# Altium footprint library PCBKU.PcbLib: 192 footprints (part 7 of 12)
Each footprint in its own frame and in the unit in brackets; x right, y up, seen from the top. Pads: shape width x height; smd on the part's side, far side on the other; paste and mask are expansions set on the pad; w line width, h text height; cw(c..) or ccw(c..) is an arc to the next point about the centre after c.
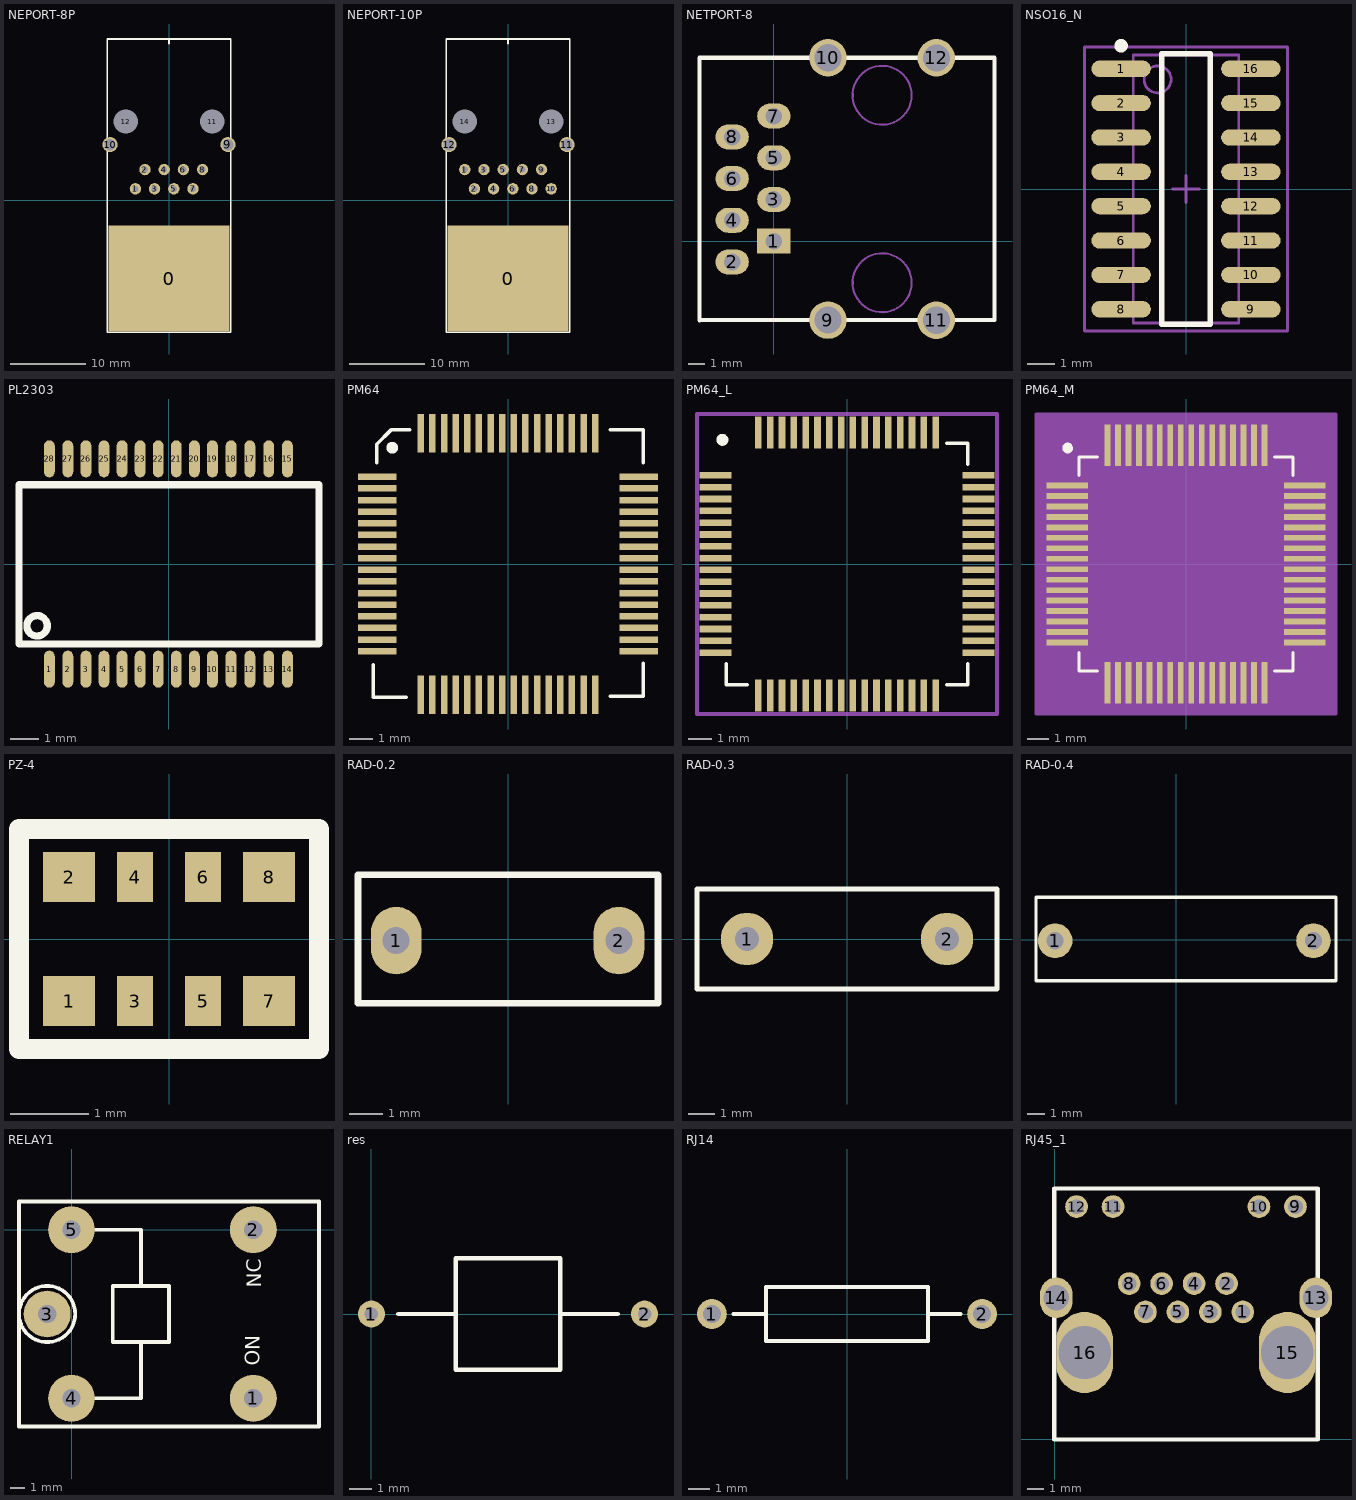
[diagram p6: the footprints below, top view; thin cyan lines are the x and y axes]

## NEPORT-8P [mm]
pads (13):
  rect 16x14 smd: 0(0.025,-10.378)
  round 1.5 hole 0.8: 1(-4.445,1.488) 2(-3.175,4.028) 3(-1.905,1.488) 4(-0.635,4.028) 5(0.635,1.488) 6(1.905,4.028) 7(3.175,1.488) 8(4.445,4.028)
  round 2 hole 1.5: 9(7.795,7.327) 10(-7.795,7.327)
  round 1.524 hole 3.2: 11(5.715,10.378) 12(-5.715,10.378)
Top Overlay:
  lines w0.203: -8.15,-17.503 8.15,-17.503 8.15,21.297 -8.15,21.297 -8.15,-17.503
  lines w0.254: 0,20.697 0,21.297

## NEPORT-10P [mm]
pads (15):
  rect 16x14 smd: 0(0.025,-10.378)
  round 1.5 hole 0.8: 1(-5.715,4.028) 2(-4.445,1.488) 3(-3.175,4.028) 4(-1.905,1.488) 5(-0.635,4.028) 6(0.635,1.488) 7(1.905,4.028) 8(3.175,1.488) 9(4.445,4.028) 10(5.715,1.488)
  round 2 hole 1.5: 11(7.795,7.327) 12(-7.795,7.327)
  round 1.524 hole 3.2: 13(5.715,10.378) 14(-5.715,10.378)
Top Overlay:
  lines w0.203: 0,20.697 0,21.297 ; -8.15,-17.503 -8.15,21.297 8.15,21.297 8.15,-17.503 -8.15,-17.503

## NETPORT-8 [mil]
height 30
pads (12):
  rect 80x60 hole 40: 1(0,0)
  oval 80x60 hole 40: 2(-100,-50) 3(0,100) 4(-100,50) 5(0,200) 6(-100,150) 7(0,300) 8(-100,250)
  round 90 hole 65: 9(129.92,-189.76) 10(129.92,440.16) 11(390,-190) 12(390,440)
Top Overlay:
  lines w10: -178.74,-190 -178.5,-189.76 ; -178.74,440 -178.58,440.16 ; 530,440 529.84,440.16 129.92,440.16 -178.58,440.16 ; 530,440.16 530,-189.76 129.92,-189.76 -178.5,-189.76 ; -178.58,440.16 -178.58,-189.69 -178.5,-189.76
Mechanical 1:
  circle w5: c260,-100 r70.8
  circle w5: c260,350 r70.8

## NSO16_N [mm] "SOIC, 16-Leads, Body 9.9x3.9mm, Pitch 1.27mm, IPC Medium Density"
height 1.75
pads (16):
  oval 2.2x0.6 smd: 1(-2.4,4.445) 2(-2.4,3.175) 3(-2.4,1.905) 4(-2.4,0.635) 5(-2.4,-0.635) 6(-2.4,-1.905) 7(-2.4,-3.175) 8(-2.4,-4.445) 9(2.4,-4.445) 10(2.4,-3.175) 11(2.4,-1.905) 12(2.4,-0.635) 13(2.4,0.635) 14(2.4,1.905) 15(2.4,3.175) 16(2.4,4.445)
Top Overlay:
  circle w0.25: c-2.4,5.295 r0.125
  lines w0.2: -0.9,-5 -0.9,5 0.9,5 0.9,-5 -0.9,-5
Mechanical 13:
  circle w0.1: c-1.05,4.05 r0.5
  lines w0.1: -1.95,-4.95 -1.95,4.95 1.95,4.95 1.95,-4.95 -1.95,-4.95
Mechanical 15:
  lines w0.1: -0.5,0 0.5,0 ; 0,-0.5 0,0.5 ; -3.75,-5.25 -3.75,5.25 3.75,5.25 3.75,-5.25 -3.75,-5.25
3D body: height 1.75, standoff 0, extent -1.95,-4.95 1.95,4.95

## PL2303 [mm]
pads (28):
  oval 0.38x1.3 smd: 1(-4.196,-3.696) 2(-3.546,-3.696) 3(-2.911,-3.696) 4(-2.276,-3.696) 5(-1.641,-3.696) 6(-1.006,-3.696) 7(-0.371,-3.696) 8(0.264,-3.696) 9(0.899,-3.696) 10(1.534,-3.696) 11(2.189,-3.696) 12(2.85,-3.696) 13(3.51,-3.696) 14(4.171,-3.696) 15(4.171,3.696) 16(3.51,3.696) 17(2.85,3.696) 18(2.189,3.696) 19(1.534,3.696) 20(0.899,3.696) 21(0.264,3.696) 22(-0.371,3.696) 23(-1.006,3.696) 24(-1.641,3.696) 25(-2.276,3.696) 26(-2.911,3.696) 27(-3.546,3.696) 28(-4.196,3.696)
Top Overlay:
  circle w0.254: c-4.628,-2.172 r0.359
  lines w0.254: -5.263,2.781 5.237,2.781 ; -5.263,2.793 -5.263,-2.807 5.237,-2.807 ; 5.278,-2.807 5.278,2.793
3D body: height 1.9, standoff 0, extent -5.125,-3.912 5.075,3.888

## PM64 [mil]
pads (64):
  rect 65.5x11 smd: 1(-221.25,147.64) 2(-221.25,127.95) 3(-221.25,108.27) 4(-221.25,88.58) 5(-221.25,68.9) 6(-221.25,49.21) 7(-221.25,29.53) 8(-221.25,9.84) 9(-221.25,-9.84) 10(-221.25,-29.53) 11(-221.25,-49.21) 12(-221.25,-68.9) 13(-221.25,-88.58) 14(-221.25,-108.27) 15(-221.25,-127.95) 16(-221.25,-147.64) 33(221.25,-147.64) 34(221.25,-127.95) 35(221.25,-108.27) 36(221.25,-88.58) 37(221.25,-68.9) 38(221.25,-49.21) 39(221.25,-29.53) 40(221.25,-9.84) 41(221.25,9.84) 42(221.25,29.53) 43(221.25,49.21) 44(221.25,68.9) 45(221.25,88.58) 46(221.25,108.27) 47(221.25,127.95) 48(221.25,147.64)
  rect 11x65.5 smd: 17(-147.64,-221.25) 18(-127.95,-221.25) 19(-108.27,-221.25) 20(-88.58,-221.25) 21(-68.9,-221.25) 22(-49.21,-221.25) 23(-29.53,-221.25) 24(-9.84,-221.25) 25(9.84,-221.25) 26(29.53,-221.25) 27(49.21,-221.25) 28(68.9,-221.25) 29(88.58,-221.25) 30(108.27,-221.25) 31(127.95,-221.25) 32(147.64,-221.25) 49(147.64,221.25) 50(127.95,221.25) 51(108.27,221.25) 52(88.58,221.25) 53(68.9,221.25) 54(49.21,221.25) 55(29.53,221.25) 56(9.84,221.25) 57(-9.84,221.25) 58(-29.53,221.25) 59(-49.21,221.25) 60(-68.9,221.25) 61(-88.58,221.25) 62(-108.27,221.25) 63(-127.95,221.25) 64(-147.64,221.25)
Top Overlay:
  lines w6: -228,-170.24 -228,-226 -172.24,-226 ; -222,171.24 -222,203 -198,227 -166.24,227 ; 173.24,-224 229,-224 229,-168.24 ; 173.24,227 229,227 229,171.24
  lines w10: -193.09,201.07 ccw(c-196,197) -191.4,198.97
3D body: height 63.1, standoff 0, extent -241,-240 239,240

## PM64_L [mil]
pads (64):
  rect 53.5x11 smd: 1(-219.25,147.64) 2(-219.25,127.95) 3(-219.25,108.27) 4(-219.25,88.58) 5(-219.25,68.9) 6(-219.25,49.21) 7(-219.25,29.53) 8(-219.25,9.84) 9(-219.25,-9.84) 10(-219.25,-29.53) 11(-219.25,-49.21) 12(-219.25,-68.9) 13(-219.25,-88.58) 14(-219.25,-108.27) 15(-219.25,-127.95) 16(-219.25,-147.64) 33(219.25,-147.64) 34(219.25,-127.95) 35(219.25,-108.27) 36(219.25,-88.58) 37(219.25,-68.9) 38(219.25,-49.21) 39(219.25,-29.53) 40(219.25,-9.84) 41(219.25,9.84) 42(219.25,29.53) 43(219.25,49.21) 44(219.25,68.9) 45(219.25,88.58) 46(219.25,108.27) 47(219.25,127.95) 48(219.25,147.64)
  rect 11x53.5 smd: 17(-147.64,-219.25) 18(-127.95,-219.25) 19(-108.27,-219.25) 20(-88.58,-219.25) 21(-68.9,-219.25) 22(-49.21,-219.25) 23(-29.53,-219.25) 24(-9.84,-219.25) 25(9.84,-219.25) 26(29.53,-219.25) 27(49.21,-219.25) 28(68.9,-219.25) 29(88.58,-219.25) 30(108.27,-219.25) 31(127.95,-219.25) 32(147.64,-219.25) 49(147.64,219.25) 50(127.95,219.25) 51(108.27,219.25) 52(88.58,219.25) 53(68.9,219.25) 54(49.21,219.25) 55(29.53,219.25) 56(9.84,219.25) 57(-9.84,219.25) 58(-29.53,219.25) 59(-49.21,219.25) 60(-68.9,219.25) 61(-88.58,219.25) 62(-108.27,219.25) 63(-127.95,219.25) 64(-147.64,219.25)
Top Overlay:
  lines w6: -201,-166.24 -201,-201 -166.24,-201 ; 166.24,-201 201,-201 201,-166.24 ; 166.24,201 201,201 201,166.24
  lines w10: -204.69,211.1 ccw(c-207.6,207.03) -203,209
Mechanical 15:
  lines w6: -250,-250 -250,250 250,250 250,-250 -250,-250
3D body: height 63.1, standoff 0, extent -239,-240 241,240

## PM64_M [mil]
pads (64):
  rect 77.5x11 smd: 1(-223.25,147.64) 2(-223.25,127.95) 3(-223.25,108.27) 4(-223.25,88.58) 5(-223.25,68.9) 6(-223.25,49.21) 7(-223.25,29.53) 8(-223.25,9.84) 9(-223.25,-9.84) 10(-223.25,-29.53) 11(-223.25,-49.21) 12(-223.25,-68.9) 13(-223.25,-88.58) 14(-223.25,-108.27) 15(-223.25,-127.95) 16(-223.25,-147.64) 33(223.25,-147.64) 34(223.25,-127.95) 35(223.25,-108.27) 36(223.25,-88.58) 37(223.25,-68.9) 38(223.25,-49.21) 39(223.25,-29.53) 40(223.25,-9.84) 41(223.25,9.84) 42(223.25,29.53) 43(223.25,49.21) 44(223.25,68.9) 45(223.25,88.58) 46(223.25,108.27) 47(223.25,127.95) 48(223.25,147.64)
  rect 11x77.5 smd: 17(-147.64,-223.25) 18(-127.95,-223.25) 19(-108.27,-223.25) 20(-88.58,-223.25) 21(-68.9,-223.25) 22(-49.21,-223.25) 23(-29.53,-223.25) 24(-9.84,-223.25) 25(9.84,-223.25) 26(29.53,-223.25) 27(49.21,-223.25) 28(68.9,-223.25) 29(88.58,-223.25) 30(108.27,-223.25) 31(127.95,-223.25) 32(147.64,-223.25) 49(147.64,223.25) 50(127.95,223.25) 51(108.27,223.25) 52(88.58,223.25) 53(68.9,223.25) 54(49.21,223.25) 55(29.53,223.25) 56(9.84,223.25) 57(-9.84,223.25) 58(-29.53,223.25) 59(-49.21,223.25) 60(-68.9,223.25) 61(-88.58,223.25) 62(-108.27,223.25) 63(-127.95,223.25) 64(-147.64,223.25)
Top Overlay:
  lines w6: -201,-166.24 -201,-201 -166.24,-201 ; -201,166.24 -201,201 -166.24,201 ; 166.24,-201 201,-201 201,-166.24 ; 166.24,201 201,201 201,166.24
  lines w10: -219.69,222.1 ccw(c-222.6,218.03) -218,220
Mechanical 15:
  region: 282,-282 -282,-282 -282,282 282,282
  lines w6: -282,-282 282,-282 282,282 -282,282 -282,-282
3D body: height 63.1, standoff 0, extent -241,-240 239,240

## PZ-4 [mil]
height 43.31
pads (8):
  rect 26x25 smd: 1(-50,-31) 2(-50,31) 7(50,-31) 8(50,31)
  rect 18x25 smd: 3(-17,-31) 4(-17,31) 5(17,-31) 6(17,31)
Top Overlay:
  lines w9.84: -75,-55 -75,55 75,55 75,-55 -75,-55

## RAD-0.2 [mm] "Jumper Wire; 2 Leads"
height 1.1
pads (2):
  oval 1.5x2 hole 0.8: 1(-3.312,-0.048) 2(3.288,-0.048)
Top Overlay:
  lines w0.2: -4.445,-1.905 4.445,-1.905 4.445,1.905 -4.445,1.905 -4.445,-1.905

## RAD-0.3 [mm] "Capacitor; 2 Leads"
height 6
pads (2):
  round 2 hole 0.9: 1(-3.81,0) 2(3.81,0)
Top Overlay:
  lines w0.2: -5.715,-1.905 5.715,-1.905 5.715,1.905 -5.715,1.905 -5.715,-1.905

## RAD-0.4 [mm]
pads (2):
  round 2 hole 1: 1(-6.996,-0.048) 2(7.904,-0.048)
Top Overlay:
  lines w0.2: -8.096,-2.348 9.204,-2.348 9.204,2.452 -8.096,2.452 -8.096,-2.348

## RELAY1 [mm]
pads (5):
  round 3.175 hole 1.25: 1(12.319,-11.43) 2(12.319,0) 3(-1.651,-5.715) 4(0,-11.43) 5(0,0)
Top Overlay:
  circle w0.254: c-1.651,-5.715 r1.905
  lines w0.254: 0.889,-11.43 4.699,-11.43 4.699,-7.62 ; 0.889,0 4.699,0 4.699,-3.81 ; 4.699,-3.81 6.604,-3.81 6.604,-7.62 2.794,-7.62 2.794,-3.81 4.699,-3.81 ; -3.556,-13.335 16.764,-13.335 16.764,1.905 -3.556,1.905 -3.556,-13.335
  text "ON" at 12.755,-9.22 h1
  text "NC" at 12.855,-3.925 h1
3D body: height 15.4, standoff -4, extent -3.633,-13.366 15.367,2.134

## res [mm]
pads (2):
  round 1.2 hole 0.6: 1(0,0) 2(12.2,0)
Top Overlay:
  lines w0.2: 1.2,0 3.775,0 ; 8.425,0 11,0 ; 3.775,0 3.775,-2.5 8.425,-2.5 8.425,2.5 3.775,2.5 3.775,0

## RJ14 [mm]
pads (2):
  round 1.4 hole 0.85: 1(-6.35,0) 2(6.35,0)
Top Overlay:
  lines w0.2: -5.334,0 -3.81,0 ; 3.81,0 5.334,0 ; -3.81,-1.27 -3.81,1.27 3.81,1.27 3.81,-1.27 -3.81,-1.27
3D body: height 4.08, standoff -5.3, extent -6.725,-1.981 6.725,1.769

## RJ45_1 [mil]
pads (16):
  round 56 hole 36: 1(464.02,314.02) 2(424.02,384.02) 3(384.02,314.02) 4(344.02,384.02) 5(304.02,314.02) 6(264.02,384.02) 7(224.02,314.02) 8(184.02,384.02) 9(594.02,574.02) 10(504.02,574.02) 11(144.02,574.02) 12(54.02,574.02)
  oval 80x100 hole 63: 13(644.02,349.02) 14(4.02,349.02)
  oval 140x200 hole 130: 15(574.02,214.02) 16(74.02,214.02)
Top Overlay:
  lines w10: -0.98,-0.98 -0.98,619.02 649.02,619.02 649.02,-0.98 -0.98,-0.98